# Altium footprint library standard.PcbLib: 227 footprints (part 15 of 15)
Each footprint in its own frame and in the unit in brackets; x right, y up, seen from the top. Pads: shape width x height; smd on the part's side, far side on the other; paste and mask are expansions set on the pad; w line width, h text height; cw(c..) or ccw(c..) is an arc to the next point about the centre after c.
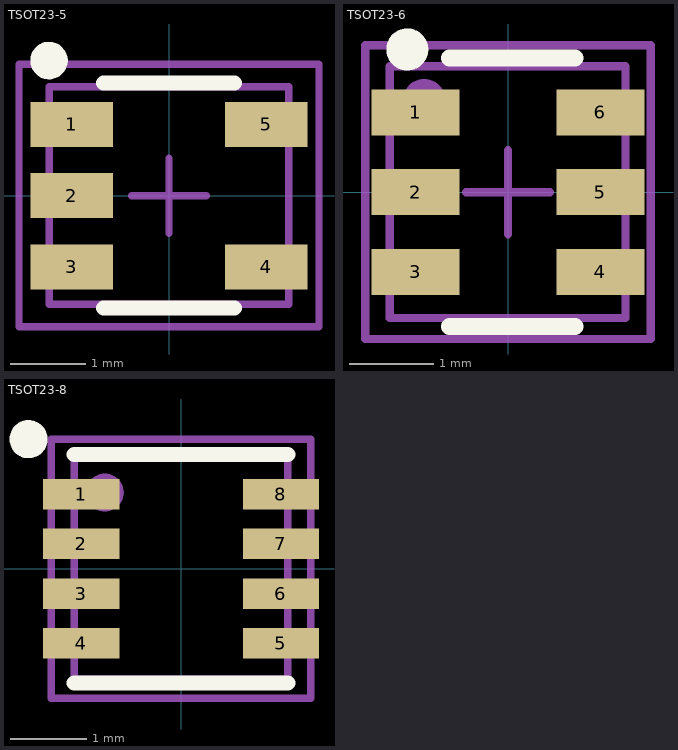
[diagram p14: the footprints below, top view; thin cyan lines are the x and y axes]

## TSOT23-5 [mm] "TSOT23, 5-Leads, Body 2,90x2,80mm, Pitch 0,95mm"
height 1.45
pads (6):
  rect 1.1x0.6 smd: 1(-1.3,0.95) 2(-1.3,0) 3(-1.3,-0.95) 4(1.3,-0.95) 5(1.3,0.95)
  round 0.5 on Mech1: ""(-1.2,1)
Top Overlay:
  circle w0.25: c-1.6,1.8 r0.125
  lines w0.2: -0.875,-1.5 0.875,-1.5 ; -0.875,1.5 0.875,1.5
Mechanical 1:
  lines w0.1: -1.595,-1.45 -1.595,1.45 1.595,1.45 1.595,-1.45 -1.595,-1.45
Mechanical 15:
  lines w0.1: -0.5,0 0.5,0 ; 0,-0.5 0,0.5 ; -2,-1.75 -2,1.75 2,1.75 2,-1.75 -2,-1.75
3D body "TSOT23-5.STEP": height 0.94, standoff -0.02, extent -1.595,-1.45 1.595,1.45

## TSOT23-6 [mm] "TSOT23, 6-Leads, Body 2,90x1,75mm, Pitch 0,9mm"
height 1
pads (7):
  rect 1.05x0.55 smd: 1(-1.1,0.95) 2(-1.1,0) 3(-1.1,-0.95) 4(1.1,-0.95) 5(1.1,0) 6(1.1,0.95)
  round 0.5 on Mech1: ""(-1,1.1)
Top Overlay:
  circle w0.25: c-1.2,1.7 r0.125
  lines w0.2: -0.7,-1.6 0.8,-1.6 ; -0.7,1.6 0.8,1.6
Mechanical 1:
  lines w0.1: -1.41,-1.5 -1.41,1.5 1.4,1.5 1.4,-1.5 -1.41,-1.5
Mechanical 15:
  lines w0.1: -0.5,0 0.5,0 ; 0,-0.5 0,0.5 ; -1.7,-1.75 -1.7,1.75 1.7,1.75 1.7,-1.75 -1.7,-1.75
3D body "TSOT23-6.STEP": height 0.86, standoff 0, extent -1.41,-1.5 1.4,1.5

## TSOT23-8 [mm]
height 1
pads (9):
  rect 1x0.4 smd: 1(-1.31,0.975) 2(-1.31,0.325) 3(-1.31,-0.325) 4(-1.31,-0.975) 5(1.31,-0.975) 6(1.31,-0.325) 7(1.31,0.325) 8(1.31,0.975)
  round 0.5 on Mech1: ""(-1,1)
Top Overlay:
  circle w0.25: c-2,1.7 r0.125
  lines w0.2: -1.4,-1.5 1.4,-1.5 ; -1.4,1.5 1.4,1.5
Mechanical 1:
  lines w0.1: -1.4,-1.45 -1.4,1.45 1.4,1.45 1.4,-1.45 -1.4,-1.45
Mechanical 15:
  lines w0.1: -1.7,-1.7 1.7,-1.7 1.7,1.7 -1.7,1.7 -1.7,-1.7
3D body "TSOT23-8_2.STEP": height 1, standoff 0, extent -1.4,-1.45 1.4,1.45